# Altium footprint library Lib_001.PcbLib: 429 footprints (part 2 of 28)
Each footprint in its own frame and in the unit in brackets; x right, y up, seen from the top. Pads: shape width x height; smd on the part's side, far side on the other; paste and mask are expansions set on the pad; w line width, h text height; cw(c..) or ccw(c..) is an arc to the next point about the centre after c.
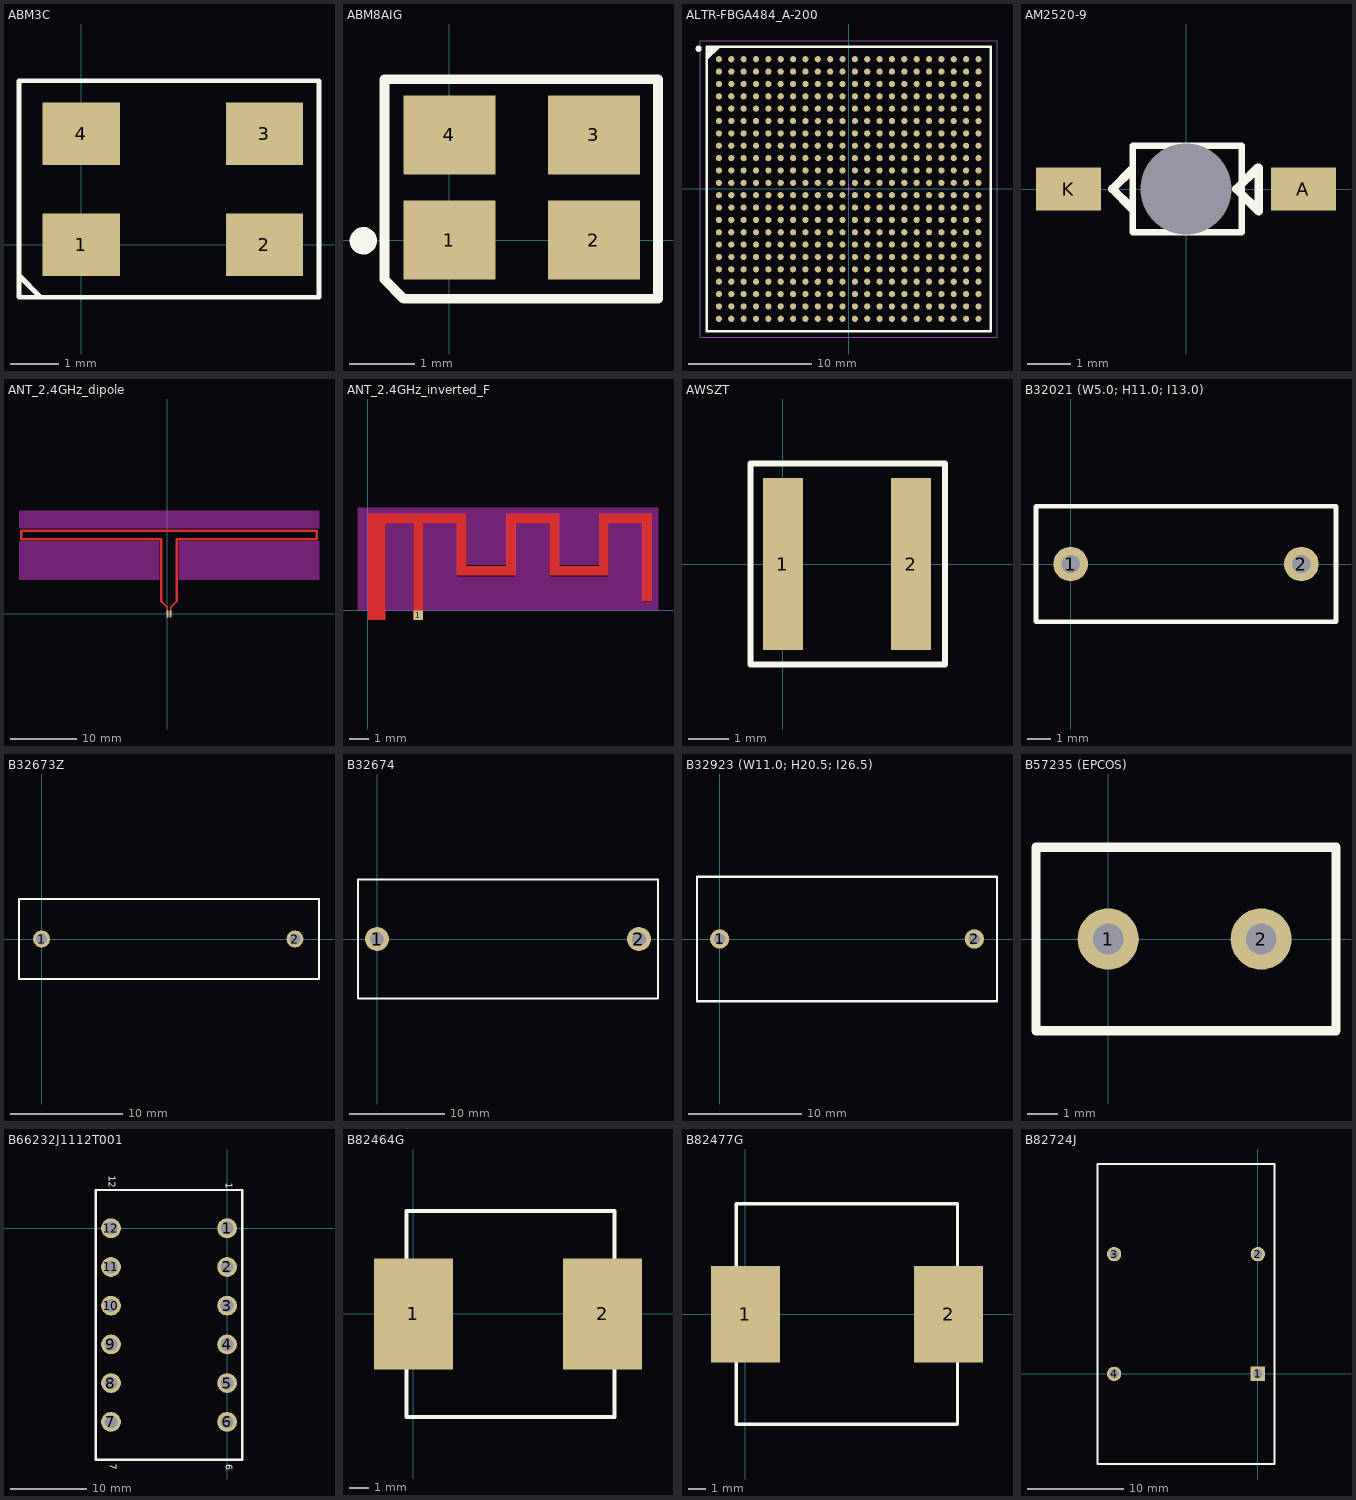
[diagram p1: the footprints below, top view; thin cyan lines are the x and y axes]

## ABM3C [mm]
pads (4):
  rect 1.6x1.3 smd: 1(0,0) 2(3.8,0) 3(3.8,2.3) 4(0,2.3)
Top Overlay:
  lines w0.102: -1.27,-0.66 -0.876,-1.054 ; -1.29,-1.09 4.93,-1.09 4.93,3.4 -1.29,3.4 -1.29,-1.09
3D body "User Library-GeyerElectronics_KX9A.STEP": height 1.01, standoff 0, extent -0.61,-0.43 4.39,2.77

## ABM8AIG [mm]
pads (4):
  rect 1.4x1.2 smd: 1(0,0) 2(2.2,0) 3(2.2,1.6) 4(0,1.6)
Top Overlay:
  circle w0.254: c-1.309,-0.01 r0.081
  lines w0.15: -0.986,-0.6 -0.986,2.449 3.175,2.449 3.175,-0.893 -0.693,-0.893 -0.986,-0.6
3D body "User Library-ABM8.step": height 0.75, standoff -0.01, extent -0.475,-0.45 2.725,2.05

## ALTR-FBGA484_A-200 [mm] "BGA, 484-Balls, Body 23x23mm, Pitch 1mm"
height 2
pads (484):
  round 0.5 smd: A1(-10.5,10.5) A2(-9.5,10.5) A3(-8.5,10.5) A4(-7.5,10.5) A5(-6.5,10.5) A6(-5.5,10.5) A7(-4.5,10.5) A8(-3.5,10.5) A9(-2.5,10.5) A10(-1.5,10.5) A11(-0.5,10.5) A12(0.5,10.5) A13(1.5,10.5) A14(2.5,10.5) A15(3.5,10.5) A16(4.5,10.5) A17(5.5,10.5) A18(6.5,10.5) A19(7.5,10.5) A20(8.5,10.5) A21(9.5,10.5) A22(10.5,10.5) AA1(-10.5,-9.5) AA2(-9.5,-9.5) AA3(-8.5,-9.5) AA4(-7.5,-9.5) AA5(-6.5,-9.5) AA6(-5.5,-9.5) AA7(-4.5,-9.5) AA8(-3.5,-9.5) AA9(-2.5,-9.5) AA10(-1.5,-9.5) AA11(-0.5,-9.5) AA12(0.5,-9.5) AA13(1.5,-9.5) AA14(2.5,-9.5) AA15(3.5,-9.5) AA16(4.5,-9.5) AA17(5.5,-9.5) AA18(6.5,-9.5) AA19(7.5,-9.5) AA20(8.5,-9.5) AA21(9.5,-9.5) AA22(10.5,-9.5) AB1(-10.5,-10.5) AB2(-9.5,-10.5) AB3(-8.5,-10.5) AB4(-7.5,-10.5) AB5(-6.5,-10.5) AB6(-5.5,-10.5) AB7(-4.5,-10.5) AB8(-3.5,-10.5) AB9(-2.5,-10.5) AB10(-1.5,-10.5) AB11(-0.5,-10.5) AB12(0.5,-10.5) AB13(1.5,-10.5) AB14(2.5,-10.5) AB15(3.5,-10.5) AB16(4.5,-10.5) AB17(5.5,-10.5) AB18(6.5,-10.5) AB19(7.5,-10.5) AB20(8.5,-10.5) AB21(9.5,-10.5) AB22(10.5,-10.5) B1(-10.5,9.5) B2(-9.5,9.5) B3(-8.5,9.5) B4(-7.5,9.5) B5(-6.5,9.5) B6(-5.5,9.5) B7(-4.5,9.5) B8(-3.5,9.5) B9(-2.5,9.5) B10(-1.5,9.5) B11(-0.5,9.5) B12(0.5,9.5) B13(1.5,9.5) B14(2.5,9.5) B15(3.5,9.5) B16(4.5,9.5) B17(5.5,9.5) B18(6.5,9.5) B19(7.5,9.5) B20(8.5,9.5) B21(9.5,9.5) B22(10.5,9.5) C1(-10.5,8.5) C2(-9.5,8.5) C3(-8.5,8.5) C4(-7.5,8.5) C5(-6.5,8.5) C6(-5.5,8.5) C7(-4.5,8.5) C8(-3.5,8.5) C9(-2.5,8.5) C10(-1.5,8.5) C11(-0.5,8.5) C12(0.5,8.5) C13(1.5,8.5) C14(2.5,8.5) C15(3.5,8.5) C16(4.5,8.5) C17(5.5,8.5) C18(6.5,8.5) C19(7.5,8.5) C20(8.5,8.5) C21(9.5,8.5) C22(10.5,8.5) D1(-10.5,7.5) D2(-9.5,7.5) D3(-8.5,7.5) D4(-7.5,7.5) D5(-6.5,7.5) D6(-5.5,7.5) D7(-4.5,7.5) D8(-3.5,7.5) D9(-2.5,7.5) D10(-1.5,7.5) D11(-0.5,7.5) D12(0.5,7.5) D13(1.5,7.5) D14(2.5,7.5) D15(3.5,7.5) D16(4.5,7.5) D17(5.5,7.5) D18(6.5,7.5) D19(7.5,7.5) D20(8.5,7.5) D21(9.5,7.5) D22(10.5,7.5) E1(-10.5,6.5) E2(-9.5,6.5) E3(-8.5,6.5) E4(-7.5,6.5) E5(-6.5,6.5) E6(-5.5,6.5) E7(-4.5,6.5) E8(-3.5,6.5) E9(-2.5,6.5) E10(-1.5,6.5) E11(-0.5,6.5) E12(0.5,6.5) E13(1.5,6.5) E14(2.5,6.5) E15(3.5,6.5) E16(4.5,6.5) E17(5.5,6.5) E18(6.5,6.5) E19(7.5,6.5) E20(8.5,6.5) E21(9.5,6.5) E22(10.5,6.5) F1(-10.5,5.5) F2(-9.5,5.5) F3(-8.5,5.5) F4(-7.5,5.5) F5(-6.5,5.5) F6(-5.5,5.5) F7(-4.5,5.5) F8(-3.5,5.5) F9(-2.5,5.5) F10(-1.5,5.5) F11(-0.5,5.5) F12(0.5,5.5) F13(1.5,5.5) F14(2.5,5.5) F15(3.5,5.5) F16(4.5,5.5) F17(5.5,5.5) F18(6.5,5.5) F19(7.5,5.5) F20(8.5,5.5) F21(9.5,5.5) F22(10.5,5.5) G1(-10.5,4.5) G2(-9.5,4.5) G3(-8.5,4.5) G4(-7.5,4.5) G5(-6.5,4.5) G6(-5.5,4.5) G7(-4.5,4.5) G8(-3.5,4.5) G9(-2.5,4.5) G10(-1.5,4.5) G11(-0.5,4.5) G12(0.5,4.5) G13(1.5,4.5) G14(2.5,4.5) G15(3.5,4.5) G16(4.5,4.5) G17(5.5,4.5) G18(6.5,4.5) G19(7.5,4.5) G20(8.5,4.5) G21(9.5,4.5) G22(10.5,4.5) H1(-10.5,3.5) H2(-9.5,3.5) H3(-8.5,3.5) H4(-7.5,3.5) H5(-6.5,3.5) H6(-5.5,3.5) H7(-4.5,3.5) H8(-3.5,3.5) H9(-2.5,3.5) H10(-1.5,3.5) H11(-0.5,3.5) H12(0.5,3.5) H13(1.5,3.5) H14(2.5,3.5) H15(3.5,3.5) H16(4.5,3.5) H17(5.5,3.5) H18(6.5,3.5) H19(7.5,3.5) H20(8.5,3.5) H21(9.5,3.5) H22(10.5,3.5) J1(-10.5,2.5) J2(-9.5,2.5) J3(-8.5,2.5) J4(-7.5,2.5) J5(-6.5,2.5) J6(-5.5,2.5) J7(-4.5,2.5) J8(-3.5,2.5) J9(-2.5,2.5) J10(-1.5,2.5) J11(-0.5,2.5) J12(0.5,2.5) J13(1.5,2.5) J14(2.5,2.5) J15(3.5,2.5) J16(4.5,2.5) J17(5.5,2.5) J18(6.5,2.5) J19(7.5,2.5) J20(8.5,2.5) J21(9.5,2.5) J22(10.5,2.5) K1(-10.5,1.5) K2(-9.5,1.5) K3(-8.5,1.5) K4(-7.5,1.5) K5(-6.5,1.5) K6(-5.5,1.5) K7(-4.5,1.5) K8(-3.5,1.5) K9(-2.5,1.5) K10(-1.5,1.5) K11(-0.5,1.5) K12(0.5,1.5) K13(1.5,1.5) K14(2.5,1.5) K15(3.5,1.5) K16(4.5,1.5) K17(5.5,1.5) K18(6.5,1.5) K19(7.5,1.5) K20(8.5,1.5) K21(9.5,1.5) K22(10.5,1.5) L1(-10.5,0.5) L2(-9.5,0.5) L3(-8.5,0.5) L4(-7.5,0.5) L5(-6.5,0.5) L6(-5.5,0.5) L7(-4.5,0.5) L8(-3.5,0.5) L9(-2.5,0.5) L10(-1.5,0.5) L11(-0.5,0.5) L12(0.5,0.5) L13(1.5,0.5) L14(2.5,0.5) L15(3.5,0.5) L16(4.5,0.5) L17(5.5,0.5) L18(6.5,0.5) L19(7.5,0.5) L20(8.5,0.5) L21(9.5,0.5) L22(10.5,0.5) M1(-10.5,-0.5) M2(-9.5,-0.5) M3(-8.5,-0.5) M4(-7.5,-0.5) M5(-6.5,-0.5) M6(-5.5,-0.5) M7(-4.5,-0.5) M8(-3.5,-0.5) M9(-2.5,-0.5) M10(-1.5,-0.5) M11(-0.5,-0.5) M12(0.5,-0.5) M13(1.5,-0.5) M14(2.5,-0.5) M15(3.5,-0.5) M16(4.5,-0.5) M17(5.5,-0.5) M18(6.5,-0.5) M19(7.5,-0.5) M20(8.5,-0.5) M21(9.5,-0.5) M22(10.5,-0.5) N1(-10.5,-1.5) N2(-9.5,-1.5) N3(-8.5,-1.5) N4(-7.5,-1.5) N5(-6.5,-1.5) N6(-5.5,-1.5) N7(-4.5,-1.5) N8(-3.5,-1.5) N9(-2.5,-1.5) N10(-1.5,-1.5) N11(-0.5,-1.5) N12(0.5,-1.5) N13(1.5,-1.5) N14(2.5,-1.5) N15(3.5,-1.5) N16(4.5,-1.5) N17(5.5,-1.5) N18(6.5,-1.5) N19(7.5,-1.5) N20(8.5,-1.5) N21(9.5,-1.5) N22(10.5,-1.5) P1(-10.5,-2.5) P2(-9.5,-2.5) P3(-8.5,-2.5) P4(-7.5,-2.5) P5(-6.5,-2.5) P6(-5.5,-2.5) P7(-4.5,-2.5) P8(-3.5,-2.5) P9(-2.5,-2.5) P10(-1.5,-2.5) P11(-0.5,-2.5) P12(0.5,-2.5) P13(1.5,-2.5) P14(2.5,-2.5) P15(3.5,-2.5) P16(4.5,-2.5) P17(5.5,-2.5) P18(6.5,-2.5) P19(7.5,-2.5) P20(8.5,-2.5) P21(9.5,-2.5) P22(10.5,-2.5) R1(-10.5,-3.5) R2(-9.5,-3.5) R3(-8.5,-3.5) R4(-7.5,-3.5) R5(-6.5,-3.5) R6(-5.5,-3.5) R7(-4.5,-3.5) R8(-3.5,-3.5) R9(-2.5,-3.5) R10(-1.5,-3.5) R11(-0.5,-3.5) R12(0.5,-3.5) R13(1.5,-3.5) R14(2.5,-3.5) R15(3.5,-3.5) R16(4.5,-3.5) R17(5.5,-3.5) R18(6.5,-3.5) R19(7.5,-3.5) R20(8.5,-3.5) R21(9.5,-3.5) R22(10.5,-3.5) T1(-10.5,-4.5) T2(-9.5,-4.5) T3(-8.5,-4.5) T4(-7.5,-4.5) T5(-6.5,-4.5) T6(-5.5,-4.5) T7(-4.5,-4.5) T8(-3.5,-4.5) T9(-2.5,-4.5) T10(-1.5,-4.5) T11(-0.5,-4.5) T12(0.5,-4.5) T13(1.5,-4.5) T14(2.5,-4.5) T15(3.5,-4.5) T16(4.5,-4.5) T17(5.5,-4.5) T18(6.5,-4.5) T19(7.5,-4.5) T20(8.5,-4.5) T21(9.5,-4.5) T22(10.5,-4.5) U1(-10.5,-5.5) U2(-9.5,-5.5) U3(-8.5,-5.5) U4(-7.5,-5.5) U5(-6.5,-5.5) U6(-5.5,-5.5) U7(-4.5,-5.5) U8(-3.5,-5.5) U9(-2.5,-5.5) U10(-1.5,-5.5) U11(-0.5,-5.5) U12(0.5,-5.5) U13(1.5,-5.5) U14(2.5,-5.5) U15(3.5,-5.5) U16(4.5,-5.5) U17(5.5,-5.5) U18(6.5,-5.5) U19(7.5,-5.5) U20(8.5,-5.5) U21(9.5,-5.5) U22(10.5,-5.5) V1(-10.5,-6.5) V2(-9.5,-6.5) V3(-8.5,-6.5) V4(-7.5,-6.5) V5(-6.5,-6.5) V6(-5.5,-6.5) V7(-4.5,-6.5) V8(-3.5,-6.5) V9(-2.5,-6.5) V10(-1.5,-6.5) V11(-0.5,-6.5) V12(0.5,-6.5) V13(1.5,-6.5) V14(2.5,-6.5) V15(3.5,-6.5) V16(4.5,-6.5) V17(5.5,-6.5) V18(6.5,-6.5) V19(7.5,-6.5) V20(8.5,-6.5) V21(9.5,-6.5) V22(10.5,-6.5) W1(-10.5,-7.5) W2(-9.5,-7.5) W3(-8.5,-7.5) W4(-7.5,-7.5) W5(-6.5,-7.5) W6(-5.5,-7.5) W7(-4.5,-7.5) W8(-3.5,-7.5) W9(-2.5,-7.5) W10(-1.5,-7.5) W11(-0.5,-7.5) W12(0.5,-7.5) W13(1.5,-7.5) W14(2.5,-7.5) W15(3.5,-7.5) W16(4.5,-7.5) W17(5.5,-7.5) W18(6.5,-7.5) W19(7.5,-7.5) W20(8.5,-7.5) W21(9.5,-7.5) W22(10.5,-7.5) Y1(-10.5,-8.5) Y2(-9.5,-8.5) Y3(-8.5,-8.5) Y4(-7.5,-8.5) Y5(-6.5,-8.5) Y6(-5.5,-8.5) Y7(-4.5,-8.5) Y8(-3.5,-8.5) Y9(-2.5,-8.5) Y10(-1.5,-8.5) Y11(-0.5,-8.5) Y12(0.5,-8.5) Y13(1.5,-8.5) Y14(2.5,-8.5) Y15(3.5,-8.5) Y16(4.5,-8.5) Y17(5.5,-8.5) Y18(6.5,-8.5) Y19(7.5,-8.5) Y20(8.5,-8.5) Y21(9.5,-8.5) Y22(10.5,-8.5)
Top Overlay:
  circle w0.25: c-12.15,11.35 r0.125
  region: -10.5,11.5 -11.5,10.5 -11.5,11.5
  lines w0.2: -11.5,10.5 -10.5,11.5 ; -11.5,-11.5 -11.5,11.5 11.5,11.5 11.5,-11.5 -11.5,-11.5
Mechanical 13:
  lines w0.1: -11.5,-11.5 -11.5,11.5 11.5,11.5 11.5,-11.5 -11.5,-11.5
Mechanical 15:
  lines w0.05: -12,-12 -12,12 12,12 12,-12 -12,-12
  lines w0.1: -0.5,0 0.5,0 ; 0,-0.5 0,0.5
3D body: height 2, standoff 0.4, extent -11.5,-11.5 11.5,11.5

## AM2520-9 [mm]
pads (3):
  rect 1.5x1 smd: A(2.7,0) K(-2.7,0)
  round 1.8 hole 2.1 unplated: ""(0,0)
Top Overlay:
  lines w0.15: -1.221,-1 1.279,-1 1.279,1 -1.221,1 -1.221,-1
  lines w0.2: -1.25,-0.44 -1.69,0 -1.25,0.44 ; 1.65,0.49 1.16,0 1.67,-0.51 1.67,0.49
3D body "AM2520-9.STEP": height 1.4, standoff -1.4, extent -3,-1 2.8,1

## ANT_2.4GHz_dipole [mm]
pads (2):
  rect 0.3x1 smd: 1(0,0) 2(0.5,0)
Top Layer:
  lines w0.2: -0.9,1.9 -0.25,1.25 0,1 0,0 ; 0.5,0 0.5,1 1.4,1.9
  lines w0.4: -0.9,1.9 -0.9,11.2 -21.9,11.2 -21.9,12.5 22.4,12.5 22.4,11.2 1.4,11.2 1.4,1.9
Keep-Out Layer:
  region: -22.25,15.5 22.75,15.5 22.75,12.85 -22.25,12.85
  region: 1.7,10.9 22.75,10.9 22.75,5.1 1.7,5.1
  region: -22.25,10.9 -1.2,10.9 -1.2,5.1 -22.25,5.1

## ANT_2.4GHz_inverted_F [mm]
pads (1):
  rect 0.5x0.5 smd: 1(2.55,-0.25)
Top Layer:
  rectangle: 7,4.4 9.7,4.9
  rectangle: 13.9,0.46 14.4,4.4
  rectangle: 7,1.76 7.5,4.4
  rectangle: 5,1.76 7,2.26
  rectangle: 4.5,1.76 5,4.4
  rectangle: 2.3,-0.5 2.8,4.4
  rectangle: 0,4.4 5,4.9
  rectangle: 0,-0.5 0.9,4.4
  rectangle: 9.2,1.76 9.7,4.4
  rectangle: 9.7,1.76 11.7,2.26
  rectangle: 11.7,1.76 12.2,4.4
  rectangle: 11.7,4.4 14.4,4.9
Keep-Out Layer:
  region: 9.7,4.9 9.7,2.3 11.7,2.3 11.7,4.9
  region: 5,4.9 5,2.3 7,2.3 7,4.9
  region: 2.8,0 2.8,4.4 4.5,4.4 4.5,1.7 7.5,1.7 7.5,4.4 9.2,4.4 9.2,1.7 12.2,1.7 12.2,4.4 13.9,4.4 13.9,0.4 14.4,0.4 14.4,0
  region: 0.9,4.4 2.3,4.4 2.3,0 0.9,0
  region: 0,0 -0.5,0 -0.5,5.2 14.7,5.2 14.7,0 14.4,0 14.4,4.9 0,4.9

## AWSZT [mm] "quartz"
pads (2):
  rect 1x4.3 smd: 1(0,0) 2(3.2,0)
Top Overlay:
  lines w0.15: -0.811,-2.505 -0.811,2.515 4.051,2.515 4.051,-2.505 -0.811,-2.505

## B32021 (W5.0; H11.0; I13.0) [mm] "capacitor"
height 21.5
pads (2):
  round 1.5 hole 0.8: 1(0,0) 2(10,0)
Top Overlay:
  lines w0.2: -1.5,-2.5 11.5,-2.5 11.5,2.5 ; -1.5,-2.499 -1.5,2.5 ; -1.498,2.5 11.497,2.5
3D body: height 2, standoff -1, extent 9.603,-0.399 10.4,0.399
3D body: height 11, standoff 0, extent -1.502,-2.498 11.499,2.494
3D body: height 2, standoff -1, extent -0.397,-0.399 0.4,0.399

## B32673Z [mm] "capacitor"
height 21.5
pads (2):
  round 1.5 hole 1: 1(0,0) 2(22.5,0)
Top Overlay:
  lines w0.2: -2,-3.556 -2,3.556 24.638,3.556 24.638,-3.556 -2,-3.556
3D body: height 16, standoff 0, extent -2,-3.556 24.638,3.556
3D body: height 2, standoff -1, extent -0.397,-0.399 0.4,0.399
3D body: height 2, standoff -1, extent 22.103,-0.399 22.9,0.399

## B32674 [mm] "capacitor"
height 21.5
pads (2):
  round 2.5 hole 1.5: 1(0,0) 2(27.5,0)
Top Overlay:
  lines w0.2: -2,-6.25 -2,6.25 29.5,6.25 29.5,-6.25 -2,-6.25
3D body: height 2, standoff -1, extent -0.397,-0.399 0.4,0.399
3D body: height 2, standoff -1, extent 27.103,-0.399 27.9,0.399
3D body: height 21.5, standoff 0, extent -2,-6.25 29.5,6.25

## B32923 (W11.0; H20.5; I26.5) [mm] "capacitor"
height 21.5
pads (2):
  round 1.7 hole 1: 1(0,0) 2(22.5,0)
Top Overlay:
  lines w0.2: -2,-5.5 24.5,-5.5 24.5,5.5 -2,5.5 -2,-5.5
3D body: height 2, standoff -1, extent 22.103,-0.399 22.9,0.399
3D body: height 2, standoff -1, extent -0.397,-0.399 0.4,0.399
3D body: height 20.5, standoff 0, extent -1.991,-5.494 24.5,5.465

## B57235 (EPCOS) [mm] "NTC thermistors"
pads (2):
  round 2 hole 1: 1(0,0) 2(5,0)
Top Overlay:
  lines w0.3: -2.36,-3 0,-3 7.45,-3 7.45,-0.25 7.45,3 0,3 -2.36,3 -2.36,-0.16 -2.36,-3
3D body "User Library-TDK_CAP_CK45_.step": height 12.5, standoff -5, extent -2.87,-2.5 8.13,2.5

## B66232J1112T001 [mm] "Ферритовый сердечник"
pads (12):
  round 2.6 hole 1.7: 1(0,0) 2(0,-5.08) 3(0,-10.16) 4(0,-15.24) 5(0,-20.32) 6(0,-25.4) 7(-15.24,-25.4) 8(-15.24,-20.32) 9(-15.24,-15.24) 10(-15.24,-10.16) 11(-15.24,-5.08) 12(-15.24,0)
Top Overlay:
  lines w0.3: -17.226,-30.39 1.974,-30.39 1.974,5.01 -17.226,5.01 -17.226,-30.39
  text "1" at -0.48,5.97 h1.52
  text "6" at -0.51,-30.93 h1.52
  text "12" at -15.83,6.9 h1.52
  text "7" at -15.72,-30.93 h1.52
3D body "User Library-Trafo EE25.step": height 32.35, standoff -3.5, extent -16.77,-20.59 1.23,4.81
3D body "User Library-Trafo EE25.step": height 32.35, standoff -3.5, extent -16.71,-30.11 1.29,-4.71

## B82464G [mm]
pads (2):
  rect 4x5.6 smd: 1(0,0) 2(9.56,-0.005)
Top Overlay:
  lines w0.2: -0.341,-5.217 8.774,-5.217 10.167,-5.217 10.167,5.206 -0.341,5.206 -0.341,-5.217
3D body "User Library-B82464G4.step": height 4.81, standoff 0, extent -0.283,-5.115 10.117,5.285

## B82477G [mm]
pads (2):
  rect 4x5.6 smd: 1(0,0) 2(11.792,0)
Top Overlay:
  lines w0.2: -0.521,-6.395 10.952,-6.395 12.302,-6.395 12.302,6.405 -0.521,6.405 -0.521,-6.395
3D body "User Library-b82477g4.step": height 8, standoff 0, extent -0.51,-6.399 12.29,6.401

## B82724J [mm] "Flter"
height 21.5
pads (4):
  rect 1.5x1.5 hole 1: 1(0,0)
  round 1.5 hole 1: 2(0,12.5) 3(-15,12.5) 4(-15,0)
Top Overlay:
  lines w0.2: -16.75,-9.4 -16.75,21.9 ; -16.731,-9.4 1.741,-9.4 ; -16.731,21.9 1.751,21.9 ; 1.75,-9.4 1.75,21.9
3D body "User Library-B82724J.step": height 33.21, standoff -4, extent -16.754,-9.413 1.746,21.887
3D body: height 2, standoff -1, extent -0.397,-0.399 0.4,0.399